# Altium footprint library con-amp.PCBLIB: 295 footprints (part 17 of 19)
Each footprint in its own frame and in the unit in brackets; x right, y up, seen from the top. Pads: shape width x height; smd on the part's side, far side on the other; paste and mask are expansions set on the pad; w line width, h text height; cw(c..) or ccw(c..) is an arc to the next point about the centre after c.
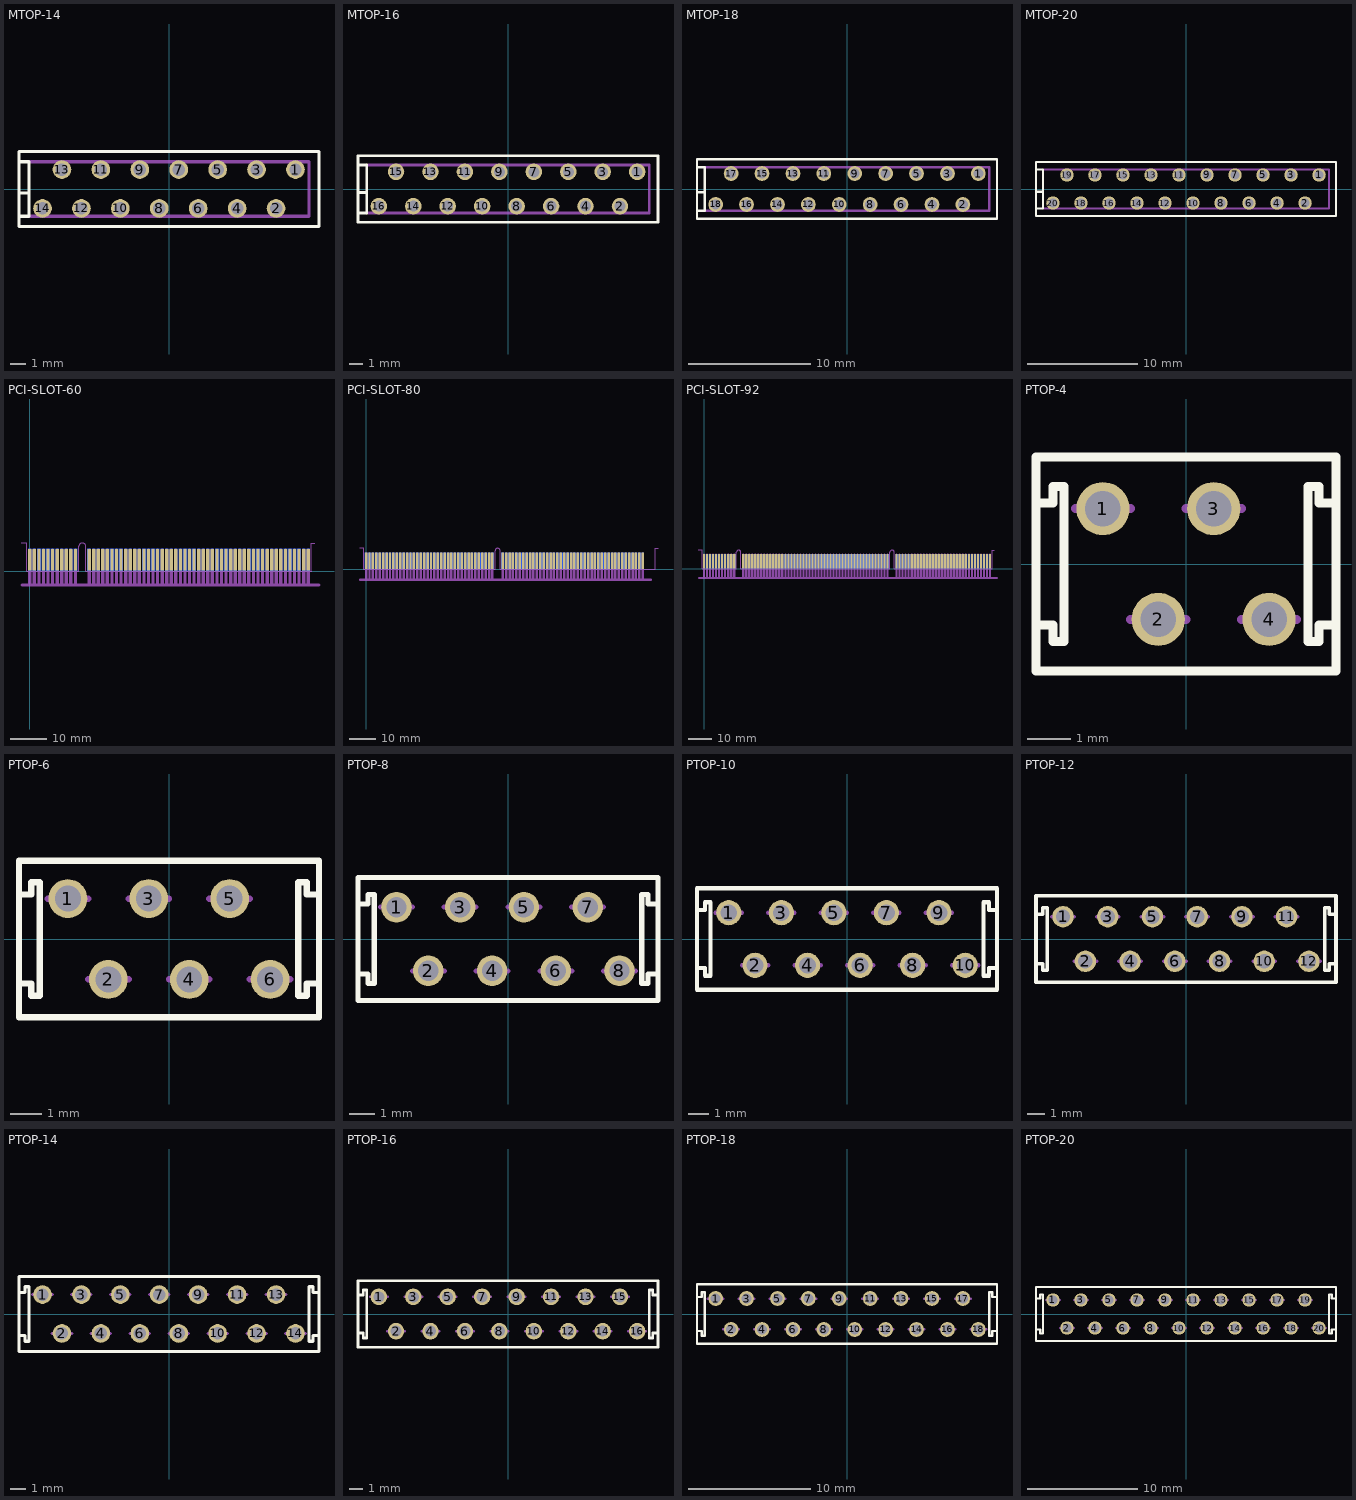
[diagram p16: the footprints below, top view; thin cyan lines are the x and y axes]

## MTOP-14 [mil]
pads (14):
  round 48 hole 32: 1(325,50) 2(275,-50) 3(225,50) 4(175,-50) 5(125,50) 6(75,-50) 7(25,50) 8(-25,-50) 9(-75,50) 10(-125,-50) 11(-175,50) 12(-225,-50) 13(-275,50) 14(-325,-50)
Top Overlay:
  lines w8: -385,-10 -360,-10 ; -385,70 -360,70 -360,-10 ; -385.43,-70 -385.43,96.46 385.43,96.46 385.43,-96.46 -385.43,-96.46 -385.43,-70 ; -385.43,-70 -360,-70 -360,-10
Mechanical 16:
  lines w8: -360,-70 360,-70 360,70 -360,70

## MTOP-16 [mil]
pads (16):
  round 48 hole 32: 1(375,50) 2(325,-50) 3(275,50) 4(225,-50) 5(175,50) 6(125,-50) 7(75,50) 8(25,-50) 9(-25,50) 10(-75,-50) 11(-125,50) 12(-175,-50) 13(-225,50) 14(-275,-50) 15(-325,50) 16(-375,-50)
Top Overlay:
  lines w8: -435,-10 -410,-10 ; -435,70 -410,70 -410,-10 ; -435.43,-70 -435.43,96.46 435.43,96.46 435.43,-96.46 -435.43,-96.46 -435.43,-70 ; -435.43,-70 -410,-70 -410,-10
Mechanical 16:
  lines w8: -410,-70 410,-70 410,70 -410,70

## MTOP-18 [mil]
pads (18):
  round 48 hole 32: 1(425,50) 2(375,-50) 3(325,50) 4(275,-50) 5(225,50) 6(175,-50) 7(125,50) 8(75,-50) 9(25,50) 10(-25,-50) 11(-75,50) 12(-125,-50) 13(-175,50) 14(-225,-50) 15(-275,50) 16(-325,-50) 17(-375,50) 18(-425,-50)
Top Overlay:
  lines w8: -485,-10 -460,-10 ; -485,70 -460,70 -460,-10 ; -485.43,-70 -485.43,96.46 485.43,96.46 485.43,-96.46 -485.43,-96.46 -485.43,-70 ; -485.43,-70 -460,-70 -460,-10
Mechanical 16:
  lines w8: -460,-70 460,-70 460,70 -460,70

## MTOP-20 [mil]
pads (20):
  round 48 hole 32: 1(475,50) 2(425,-50) 3(375,50) 4(325,-50) 5(275,50) 6(225,-50) 7(175,50) 8(125,-50) 9(75,50) 10(25,-50) 11(-25,50) 12(-75,-50) 13(-125,50) 14(-175,-50) 15(-225,50) 16(-275,-50) 17(-325,50) 18(-375,-50) 19(-425,50) 20(-475,-50)
Top Overlay:
  lines w8: -535,-10 -510,-10 ; -535,70 -510,70 -510,-10 ; -535.43,-70 -535.43,96.46 535.43,96.46 535.43,-96.46 -535.43,-96.46 -535.43,-70 ; -535.43,-70 -510,-70 -510,-10
Mechanical 16:
  lines w8: -510,-70 510,-70 510,70 -510,70

## PCI-SLOT-60 [mm]
pads (120):
  rect 0.91x6 smd: 1(0,3.22) 3(1.27,3.22) 5(2.54,3.22) 7(3.81,3.22) 9(5.08,3.22) 11(6.35,3.22) 13(7.62,3.22) 15(8.89,3.22) 17(10.16,3.22) 19(11.43,3.22) 21(12.7,3.22) 23(16.51,3.22) 25(17.78,3.22) 27(19.05,3.22) 29(20.32,3.22) 31(21.59,3.22) 33(22.86,3.22) 35(24.13,3.22) 37(25.4,3.22) 39(26.67,3.22) 41(27.94,3.22) 43(29.21,3.22) 45(30.48,3.22) 47(31.75,3.22) 49(33.02,3.22) 51(34.29,3.22) 53(35.56,3.22) 55(36.83,3.22) 57(38.1,3.22) 59(39.37,3.22) 61(40.64,3.22) 63(41.91,3.22) 65(43.18,3.22) 67(44.45,3.22) 69(45.72,3.22) 71(46.99,3.22) 73(48.26,3.22) 75(49.53,3.22) 77(50.8,3.22) 79(52.07,3.22) 81(53.34,3.22) 83(54.61,3.22) 85(55.88,3.22) 87(57.15,3.22) 89(58.42,3.22) 91(59.69,3.22) 93(60.96,3.22) 95(62.23,3.22) 97(63.5,3.22) 99(64.77,3.22) 101(66.04,3.22) 103(67.31,3.22) 105(68.58,3.22) 107(69.85,3.22) 109(71.12,3.22) 111(72.39,3.22) 113(73.66,3.22) 115(74.93,3.22) 117(76.2,3.22) 119(77.47,3.22)
  rect 0.91x6 smd far side: 2(0,3.22) 4(1.27,3.22) 6(2.54,3.22) 8(3.81,3.22) 10(5.08,3.22) 12(6.35,3.22) 14(7.62,3.22) 16(8.89,3.22) 18(10.16,3.22) 20(11.43,3.22) 22(12.7,3.22) 24(16.51,3.22) 26(17.78,3.22) 28(19.05,3.22) 30(20.32,3.22) 32(21.59,3.22) 34(22.86,3.22) 36(24.13,3.22) 38(25.4,3.22) 40(26.67,3.22) 42(27.94,3.22) 44(29.21,3.22) 46(30.48,3.22) 48(31.75,3.22) 50(33.02,3.22) 52(34.29,3.22) 54(35.56,3.22) 56(36.83,3.22) 58(38.1,3.22) 60(39.37,3.22) 62(40.64,3.22) 64(41.91,3.22) 66(43.18,3.22) 68(44.45,3.22) 70(45.72,3.22) 72(46.99,3.22) 74(48.26,3.22) 76(49.53,3.22) 78(50.8,3.22) 80(52.07,3.22) 82(53.34,3.22) 84(54.61,3.22) 86(55.88,3.22) 88(57.15,3.22) 90(58.42,3.22) 92(59.69,3.22) 94(60.96,3.22) 96(62.23,3.22) 98(63.5,3.22) 100(64.77,3.22) 102(66.04,3.22) 104(67.31,3.22) 106(68.58,3.22) 108(69.85,3.22) 110(71.12,3.22) 112(72.39,3.22) 114(73.66,3.22) 116(74.93,3.22) 118(76.2,3.22) 120(77.47,3.22)
Mechanical 1:
  lines w0: -2.4,7.87 -0.88,7.87 -0.88,0 13.655,0 13.655,6.915 cw(c14.61,6.915) 15.565,6.915 15.565,0 78.36,0 ; 78.425,0 78.36,0 ; 79.32,7.87 78.36,7.87 78.36,0
Mechanical 23:
  lines w0.9: -2.15,-3.81 80.4,-3.81
  lines w0.91: 0,-3.52 0,5.915 ; 1.27,-3.52 1.27,5.915 ; 2.54,-3.52 2.54,5.915 ; 3.81,-3.52 3.81,5.915 ; 5.08,-3.52 5.08,5.915 ; 6.35,-3.52 6.35,5.915 ; 7.62,-3.52 7.62,5.915 ; 8.89,-3.52 8.89,5.915 ; 10.16,-3.52 10.16,5.915 ; 11.43,-3.52 11.43,5.915 ; 12.7,-3.52 12.7,5.915 ; 16.51,-3.52 16.51,5.915 ; 17.78,-3.52 17.78,5.915 ; 19.05,-3.52 19.05,5.915 ; 20.32,-3.52 20.32,5.915 ; 21.59,-3.52 21.59,5.915 ; 22.86,-3.52 22.86,5.915 ; 24.13,-3.52 24.13,5.915 ; 25.4,-3.52 25.4,5.915 ; 26.67,-3.52 26.67,5.915 ; 27.94,-3.52 27.94,5.915 ; 29.21,-3.52 29.21,5.915 ; 30.48,-3.52 30.48,5.915 ; 31.75,-3.52 31.75,5.915 ; 33.02,-3.52 33.02,5.915 ; 34.29,-3.52 34.29,5.915 ; 35.56,-3.52 35.56,5.915 ; 36.83,-3.52 36.83,5.915 ; 38.1,-3.52 38.1,5.915 ; 39.37,-3.52 39.37,5.915 ; 40.64,-3.52 40.64,5.915 ; 41.91,-3.52 41.91,5.915 ; 43.18,-3.52 43.18,5.915 ; 44.45,-3.52 44.45,5.915 ; 45.72,-3.52 45.72,5.915 ; 46.99,-3.52 46.99,5.915 ; 48.26,-3.52 48.26,5.915 ; 49.53,-3.52 49.53,5.915 ; 50.8,-3.52 50.8,5.915 ; 52.07,-3.52 52.07,5.915 ; 53.34,-3.52 53.34,5.915 ; 54.61,-3.52 54.61,5.915 ; 55.88,-3.52 55.88,5.915 ; 57.15,-3.52 57.15,5.915 ; 58.42,-3.52 58.42,5.915 ; 59.69,-3.52 59.69,5.915 ; 60.96,-3.52 60.96,5.915 ; 62.23,-3.52 62.23,5.915 ; 63.5,-3.52 63.5,5.915 ; 64.77,-3.52 64.77,5.915 ; 66.04,-3.52 66.04,5.915 ; 67.31,-3.52 67.31,5.915 ; 68.58,-3.52 68.58,5.915 ; 69.85,-3.52 69.85,5.915 ; 71.12,-3.52 71.12,5.915 ; 72.39,-3.52 72.39,5.915 ; 73.66,-3.52 73.66,5.915 ; 74.93,-3.52 74.93,5.915 ; 76.2,-3.52 76.2,5.915 ; 77.47,-3.52 77.47,5.915
Mechanical 24:
  lines w0.9: -2.15,-3.81 80.4,-3.81
  lines w0.91: 0,-3.52 0,5.915 ; 1.27,-3.52 1.27,5.915 ; 2.54,-3.52 2.54,5.915 ; 3.81,-3.52 3.81,5.915 ; 5.08,-3.52 5.08,5.915 ; 6.35,-3.52 6.35,5.915 ; 7.62,-3.52 7.62,5.915 ; 8.89,-3.52 8.89,5.915 ; 10.16,-3.52 10.16,5.915 ; 11.43,-3.52 11.43,5.915 ; 12.7,-3.52 12.7,5.915 ; 16.51,-3.52 16.51,5.915 ; 17.78,-3.52 17.78,5.915 ; 19.05,-3.52 19.05,5.915 ; 20.32,-3.52 20.32,5.915 ; 21.59,-3.52 21.59,5.915 ; 22.86,-3.52 22.86,5.915 ; 24.13,-3.52 24.13,5.915 ; 25.4,-3.52 25.4,5.915 ; 26.67,-3.52 26.67,5.915 ; 27.94,-3.52 27.94,5.915 ; 29.21,-3.52 29.21,5.915 ; 30.48,-3.52 30.48,5.915 ; 31.75,-3.52 31.75,5.915 ; 33.02,-3.52 33.02,5.915 ; 34.29,-3.52 34.29,5.915 ; 35.56,-3.52 35.56,5.915 ; 36.83,-3.52 36.83,5.915 ; 38.1,-3.52 38.1,5.915 ; 39.37,-3.52 39.37,5.915 ; 40.64,-3.52 40.64,5.915 ; 41.91,-3.52 41.91,5.915 ; 43.18,-3.52 43.18,5.915 ; 44.45,-3.52 44.45,5.915 ; 45.72,-3.52 45.72,5.915 ; 46.99,-3.52 46.99,5.915 ; 48.26,-3.52 48.26,5.915 ; 49.53,-3.52 49.53,5.915 ; 50.8,-3.52 50.8,5.915 ; 52.07,-3.52 52.07,5.915 ; 53.34,-3.52 53.34,5.915 ; 54.61,-3.52 54.61,5.915 ; 55.88,-3.52 55.88,5.915 ; 57.15,-3.52 57.15,5.915 ; 58.42,-3.52 58.42,5.915 ; 59.69,-3.52 59.69,5.915 ; 60.96,-3.52 60.96,5.915 ; 62.23,-3.52 62.23,5.915 ; 63.5,-3.52 63.5,5.915 ; 64.77,-3.52 64.77,5.915 ; 66.04,-3.52 66.04,5.915 ; 67.31,-3.52 67.31,5.915 ; 68.58,-3.52 68.58,5.915 ; 69.85,-3.52 69.85,5.915 ; 71.12,-3.52 71.12,5.915 ; 72.39,-3.52 72.39,5.915 ; 73.66,-3.52 73.66,5.915 ; 74.93,-3.52 74.93,5.915 ; 76.2,-3.52 76.2,5.915 ; 77.47,-3.52 77.47,5.915

## PCI-SLOT-80 [mm]
pads (160):
  rect 0.91x6 smd: 1(0,3.22) 3(1.27,3.22) 5(2.54,3.22) 7(3.81,3.22) 9(5.08,3.22) 11(6.35,3.22) 13(7.62,3.22) 15(8.89,3.22) 17(10.16,3.22) 19(11.43,3.22) 21(12.7,3.22) 23(13.97,3.22) 25(15.24,3.22) 27(16.51,3.22) 29(17.78,3.22) 31(19.05,3.22) 33(20.32,3.22) 35(21.59,3.22) 37(22.86,3.22) 39(24.13,3.22) 41(25.4,3.22) 43(26.67,3.22) 45(27.94,3.22) 47(29.21,3.22) 49(30.48,3.22) 51(31.75,3.22) 53(33.02,3.22) 55(34.29,3.22) 57(35.56,3.22) 59(36.83,3.22) 61(38.1,3.22) 63(39.37,3.22) 65(40.64,3.22) 67(41.91,3.22) 69(43.18,3.22) 71(44.45,3.22) 73(45.72,3.22) 75(46.99,3.22) 77(50.8,3.22) 79(52.07,3.22) 81(53.34,3.22) 83(54.61,3.22) 85(55.88,3.22) 87(57.15,3.22) 89(58.42,3.22) 91(59.69,3.22) 93(60.96,3.22) 95(62.23,3.22) 97(63.5,3.22) 99(64.77,3.22) 101(66.04,3.22) 103(67.31,3.22) 105(68.58,3.22) 107(69.85,3.22) 109(71.12,3.22) 111(72.39,3.22) 113(73.66,3.22) 115(74.93,3.22) 117(76.2,3.22) 119(77.47,3.22) 121(78.74,3.22) 123(80.01,3.22) 125(81.28,3.22) 127(82.55,3.22) 129(83.82,3.22) 131(85.09,3.22) 133(86.36,3.22) 135(87.63,3.22) 137(88.9,3.22) 139(90.17,3.22) 141(91.44,3.22) 143(92.71,3.22) 145(93.98,3.22) 147(95.25,3.22) 149(96.52,3.22) 151(97.79,3.22) 153(99.06,3.22) 155(100.33,3.22) 157(101.6,3.22) 159(102.87,3.22)
  rect 0.91x6 smd far side: 2(0,3.22) 4(1.27,3.22) 6(2.54,3.22) 8(3.81,3.22) 10(5.08,3.22) 12(6.35,3.22) 14(7.62,3.22) 16(8.89,3.22) 18(10.16,3.22) 20(11.43,3.22) 22(12.7,3.22) 24(13.97,3.22) 26(15.24,3.22) 28(16.51,3.22) 30(17.78,3.22) 32(19.05,3.22) 34(20.32,3.22) 36(21.59,3.22) 38(22.86,3.22) 40(24.13,3.22) 42(25.4,3.22) 44(26.67,3.22) 46(27.94,3.22) 48(29.21,3.22) 50(30.48,3.22) 52(31.75,3.22) 54(33.02,3.22) 56(34.29,3.22) 58(35.56,3.22) 60(36.83,3.22) 62(38.1,3.22) 64(39.37,3.22) 66(40.64,3.22) 68(41.91,3.22) 70(43.18,3.22) 72(44.45,3.22) 74(45.72,3.22) 76(46.99,3.22) 78(50.8,3.22) 80(52.07,3.22) 82(53.34,3.22) 84(54.61,3.22) 86(55.88,3.22) 88(57.15,3.22) 90(58.42,3.22) 92(59.69,3.22) 94(60.96,3.22) 96(62.23,3.22) 98(63.5,3.22) 100(64.77,3.22) 102(66.04,3.22) 104(67.31,3.22) 106(68.58,3.22) 108(69.85,3.22) 110(71.12,3.22) 112(72.39,3.22) 114(73.66,3.22) 116(74.93,3.22) 118(76.2,3.22) 120(77.47,3.22) 122(78.74,3.22) 124(80.01,3.22) 126(81.28,3.22) 128(82.55,3.22) 130(83.82,3.22) 132(85.09,3.22) 134(86.36,3.22) 136(87.63,3.22) 138(88.9,3.22) 140(90.17,3.22) 142(91.44,3.22) 144(92.71,3.22) 146(93.98,3.22) 148(95.25,3.22) 150(96.52,3.22) 152(97.79,3.22) 154(99.06,3.22) 156(100.33,3.22) 158(101.6,3.22) 160(102.87,3.22)
Mechanical 1:
  lines w0: -2.4,7.87 -0.88,7.87 -0.88,0 47.945,0 47.945,6.915 cw(c48.9,6.915) 49.855,6.915 49.855,0 107.57,0 107.57,7.87 108.53,7.87
Mechanical 23:
  lines w0.9: -2.15,-3.81 105.8,-3.81
  lines w0.91: 0,-3.52 0,5.915 ; 1.27,-3.52 1.27,5.915 ; 2.54,-3.52 2.54,5.915 ; 3.81,-3.52 3.81,5.915 ; 5.08,-3.52 5.08,5.915 ; 6.35,-3.52 6.35,5.915 ; 7.62,-3.52 7.62,5.915 ; 8.89,-3.52 8.89,5.915 ; 10.16,-3.52 10.16,5.915 ; 11.43,-3.52 11.43,5.915 ; 12.7,-3.52 12.7,5.915 ; 13.97,-3.52 13.97,5.915 ; 15.24,-3.52 15.24,5.915 ; 16.51,-3.52 16.51,5.915 ; 17.78,-3.52 17.78,5.915 ; 19.05,-3.52 19.05,5.915 ; 20.32,-3.52 20.32,5.915 ; 21.59,-3.52 21.59,5.915 ; 22.86,-3.52 22.86,5.915 ; 24.13,-3.52 24.13,5.915 ; 25.4,-3.52 25.4,5.915 ; 26.67,-3.52 26.67,5.915 ; 27.94,-3.52 27.94,5.915 ; 29.21,-3.52 29.21,5.915 ; 30.48,-3.52 30.48,5.915 ; 31.75,-3.52 31.75,5.915 ; 33.02,-3.52 33.02,5.915 ; 34.29,-3.52 34.29,5.915 ; 35.56,-3.52 35.56,5.915 ; 36.83,-3.52 36.83,5.915 ; 38.1,-3.52 38.1,5.915 ; 39.37,-3.52 39.37,5.915 ; 40.64,-3.52 40.64,5.915 ; 41.91,-3.52 41.91,5.915 ; 43.18,-3.52 43.18,5.915 ; 44.45,-3.52 44.45,5.915 ; 45.72,-3.52 45.72,5.915 ; 46.99,-3.52 46.99,5.915 ; 50.8,-3.52 50.8,5.915 ; 52.07,-3.52 52.07,5.915 ; 53.34,-3.52 53.34,5.915 ; 54.61,-3.52 54.61,5.915 ; 55.88,-3.52 55.88,5.915 ; 57.15,-3.52 57.15,5.915 ; 58.42,-3.52 58.42,5.915 ; 59.69,-3.52 59.69,5.915 ; 60.96,-3.52 60.96,5.915 ; 62.23,-3.52 62.23,5.915 ; 63.5,-3.52 63.5,5.915 ; 64.77,-3.52 64.77,5.915 ; 66.04,-3.52 66.04,5.915 ; 67.31,-3.52 67.31,5.915 ; 68.58,-3.52 68.58,5.915 ; 69.85,-3.52 69.85,5.915 ; 71.12,-3.52 71.12,5.915 ; 72.39,-3.52 72.39,5.915 ; 73.66,-3.52 73.66,5.915 ; 74.93,-3.52 74.93,5.915 ; 76.2,-3.52 76.2,5.915 ; 77.47,-3.52 77.47,5.915 ; 78.74,-3.52 78.74,5.915 ; 80.01,-3.52 80.01,5.915 ; 81.28,-3.52 81.28,5.915 ; 82.55,-3.52 82.55,5.915 ; 83.82,-3.52 83.82,5.915 ; 85.09,-3.52 85.09,5.915 ; 86.36,-3.52 86.36,5.915 ; 87.63,-3.52 87.63,5.915 ; 88.9,-3.52 88.9,5.915 ; 90.17,-3.52 90.17,5.915 ; 91.44,-3.52 91.44,5.915 ; 92.71,-3.52 92.71,5.915 ; 93.98,-3.52 93.98,5.915 ; 95.25,-3.52 95.25,5.915 ; 96.52,-3.52 96.52,5.915 ; 97.79,-3.52 97.79,5.915 ; 99.06,-3.52 99.06,5.915 ; 100.33,-3.52 100.33,5.915 ; 101.6,-3.52 101.6,5.915 ; 102.87,-3.52 102.87,5.915
Mechanical 24:
  lines w0.9: -2.15,-3.81 105.8,-3.81
  lines w0.91: 0,-3.52 0,5.915 ; 1.27,-3.52 1.27,5.915 ; 2.54,-3.52 2.54,5.915 ; 3.81,-3.52 3.81,5.915 ; 5.08,-3.52 5.08,5.915 ; 6.35,-3.52 6.35,5.915 ; 7.62,-3.52 7.62,5.915 ; 8.89,-3.52 8.89,5.915 ; 10.16,-3.52 10.16,5.915 ; 11.43,-3.52 11.43,5.915 ; 12.7,-3.52 12.7,5.915 ; 13.97,-3.52 13.97,5.915 ; 15.24,-3.52 15.24,5.915 ; 16.51,-3.52 16.51,5.915 ; 17.78,-3.52 17.78,5.915 ; 19.05,-3.52 19.05,5.915 ; 20.32,-3.52 20.32,5.915 ; 21.59,-3.52 21.59,5.915 ; 22.86,-3.52 22.86,5.915 ; 24.13,-3.52 24.13,5.915 ; 25.4,-3.52 25.4,5.915 ; 26.67,-3.52 26.67,5.915 ; 27.94,-3.52 27.94,5.915 ; 29.21,-3.52 29.21,5.915 ; 30.48,-3.52 30.48,5.915 ; 31.75,-3.52 31.75,5.915 ; 33.02,-3.52 33.02,5.915 ; 34.29,-3.52 34.29,5.915 ; 35.56,-3.52 35.56,5.915 ; 36.83,-3.52 36.83,5.915 ; 38.1,-3.52 38.1,5.915 ; 39.37,-3.52 39.37,5.915 ; 40.64,-3.52 40.64,5.915 ; 41.91,-3.52 41.91,5.915 ; 43.18,-3.52 43.18,5.915 ; 44.45,-3.52 44.45,5.915 ; 45.72,-3.52 45.72,5.915 ; 46.99,-3.52 46.99,5.915 ; 50.8,-3.52 50.8,5.915 ; 52.07,-3.52 52.07,5.915 ; 53.34,-3.52 53.34,5.915 ; 54.61,-3.52 54.61,5.915 ; 55.88,-3.52 55.88,5.915 ; 57.15,-3.52 57.15,5.915 ; 58.42,-3.52 58.42,5.915 ; 59.69,-3.52 59.69,5.915 ; 60.96,-3.52 60.96,5.915 ; 62.23,-3.52 62.23,5.915 ; 63.5,-3.52 63.5,5.915 ; 64.77,-3.52 64.77,5.915 ; 66.04,-3.52 66.04,5.915 ; 67.31,-3.52 67.31,5.915 ; 68.58,-3.52 68.58,5.915 ; 69.85,-3.52 69.85,5.915 ; 71.12,-3.52 71.12,5.915 ; 72.39,-3.52 72.39,5.915 ; 73.66,-3.52 73.66,5.915 ; 74.93,-3.52 74.93,5.915 ; 76.2,-3.52 76.2,5.915 ; 77.47,-3.52 77.47,5.915 ; 78.74,-3.52 78.74,5.915 ; 80.01,-3.52 80.01,5.915 ; 81.28,-3.52 81.28,5.915 ; 82.55,-3.52 82.55,5.915 ; 83.82,-3.52 83.82,5.915 ; 85.09,-3.52 85.09,5.915 ; 86.36,-3.52 86.36,5.915 ; 87.63,-3.52 87.63,5.915 ; 88.9,-3.52 88.9,5.915 ; 90.17,-3.52 90.17,5.915 ; 91.44,-3.52 91.44,5.915 ; 92.71,-3.52 92.71,5.915 ; 93.98,-3.52 93.98,5.915 ; 95.25,-3.52 95.25,5.915 ; 96.52,-3.52 96.52,5.915 ; 97.79,-3.52 97.79,5.915 ; 99.06,-3.52 99.06,5.915 ; 100.33,-3.52 100.33,5.915 ; 101.6,-3.52 101.6,5.915 ; 102.87,-3.52 102.87,5.915

## PCI-SLOT-92 [mm]
pads (184):
  rect 0.91x6 smd: 1(0,3.22) 3(1.27,3.22) 5(2.54,3.22) 7(3.81,3.22) 9(5.08,3.22) 11(6.35,3.22) 13(7.62,3.22) 15(8.89,3.22) 17(10.16,3.22) 19(11.43,3.22) 21(12.7,3.22) 23(16.51,3.22) 25(17.78,3.22) 27(19.05,3.22) 29(20.32,3.22) 31(21.59,3.22) 33(22.86,3.22) 35(24.13,3.22) 37(25.4,3.22) 39(26.67,3.22) 41(27.94,3.22) 43(29.21,3.22) 45(30.48,3.22) 47(31.75,3.22) 49(33.02,3.22) 51(34.29,3.22) 53(35.56,3.22) 55(36.83,3.22) 57(38.1,3.22) 59(39.37,3.22) 61(40.64,3.22) 63(41.91,3.22) 65(43.18,3.22) 67(44.45,3.22) 69(45.72,3.22) 71(46.99,3.22) 73(48.26,3.22) 75(49.53,3.22) 77(50.8,3.22) 79(52.07,3.22) 81(53.34,3.22) 83(54.61,3.22) 85(55.88,3.22) 87(57.15,3.22) 89(58.42,3.22) 91(59.69,3.22) 93(60.96,3.22) 95(62.23,3.22) 97(63.5,3.22) 99(64.77,3.22) 101(66.04,3.22) 103(67.31,3.22) 105(68.58,3.22) 107(69.85,3.22) 109(71.12,3.22) 111(72.39,3.22) 113(73.66,3.22) 115(74.93,3.22) 117(76.2,3.22) 119(77.47,3.22) 121(81.28,3.22) 123(82.55,3.22) 125(83.82,3.22) 127(85.09,3.22) 129(86.36,3.22) 131(87.63,3.22) 133(88.9,3.22) 135(90.17,3.22) 137(91.44,3.22) 139(92.71,3.22) 141(93.98,3.22) 143(95.25,3.22) 145(96.52,3.22) 147(97.79,3.22) 149(99.06,3.22) 151(100.33,3.22) 153(101.6,3.22) 155(102.87,3.22) 157(104.14,3.22) 159(105.41,3.22) 161(106.68,3.22) 163(107.95,3.22) 165(109.22,3.22) 167(110.49,3.22) 169(111.76,3.22) 171(113.03,3.22) 173(114.3,3.22) 175(115.57,3.22) 177(116.84,3.22) 179(118.11,3.22) 181(119.38,3.22) 183(120.65,3.22)
  rect 0.91x6 smd far side: 2(0,3.22) 4(1.27,3.22) 6(2.54,3.22) 8(3.81,3.22) 10(5.08,3.22) 12(6.35,3.22) 14(7.62,3.22) 16(8.89,3.22) 18(10.16,3.22) 20(11.43,3.22) 22(12.7,3.22) 24(16.51,3.22) 26(17.78,3.22) 28(19.05,3.22) 30(20.32,3.22) 32(21.59,3.22) 34(22.86,3.22) 36(24.13,3.22) 38(25.4,3.22) 40(26.67,3.22) 42(27.94,3.22) 44(29.21,3.22) 46(30.48,3.22) 48(31.75,3.22) 50(33.02,3.22) 52(34.29,3.22) 54(35.56,3.22) 56(36.83,3.22) 58(38.1,3.22) 60(39.37,3.22) 62(40.64,3.22) 64(41.91,3.22) 66(43.18,3.22) 68(44.45,3.22) 70(45.72,3.22) 72(46.99,3.22) 74(48.26,3.22) 76(49.53,3.22) 78(50.8,3.22) 80(52.07,3.22) 82(53.34,3.22) 84(54.61,3.22) 86(55.88,3.22) 88(57.15,3.22) 90(58.42,3.22) 92(59.69,3.22) 94(60.96,3.22) 96(62.23,3.22) 98(63.5,3.22) 100(64.77,3.22) 102(66.04,3.22) 104(67.31,3.22) 106(68.58,3.22) 108(69.85,3.22) 110(71.12,3.22) 112(72.39,3.22) 114(73.66,3.22) 116(74.93,3.22) 118(76.2,3.22) 120(77.47,3.22) 122(81.28,3.22) 124(82.55,3.22) 126(83.82,3.22) 128(85.09,3.22) 130(86.36,3.22) 132(87.63,3.22) 134(88.9,3.22) 136(90.17,3.22) 138(91.44,3.22) 140(92.71,3.22) 142(93.98,3.22) 144(95.25,3.22) 146(96.52,3.22) 148(97.79,3.22) 150(99.06,3.22) 152(100.33,3.22) 154(101.6,3.22) 156(102.87,3.22) 158(104.14,3.22) 160(105.41,3.22) 162(106.68,3.22) 164(107.95,3.22) 166(109.22,3.22) 168(110.49,3.22) 170(111.76,3.22) 172(113.03,3.22) 174(114.3,3.22) 176(115.57,3.22) 178(116.84,3.22) 180(118.11,3.22) 182(119.38,3.22) 184(120.65,3.22)
Mechanical 1:
  lines w0: -2.4,7.87 -0.88,7.87 -0.88,0 13.655,0 13.655,6.915 cw(c14.61,6.915) 15.565,6.915 15.565,0 78.425,0 78.425,6.915 cw(c79.38,6.915) 80.335,6.915 80.335,0 121.54,0 121.54,7.87 122.5,7.87
Mechanical 23:
  lines w0.9: -2.15,-3.81 123.58,-3.81
  lines w0.91: 0,-3.52 0,5.915 ; 1.27,-3.52 1.27,5.915 ; 2.54,-3.52 2.54,5.915 ; 3.81,-3.52 3.81,5.915 ; 5.08,-3.52 5.08,5.915 ; 6.35,-3.52 6.35,5.915 ; 7.62,-3.52 7.62,5.915 ; 8.89,-3.52 8.89,5.915 ; 10.16,-3.52 10.16,5.915 ; 11.43,-3.52 11.43,5.915 ; 12.7,-3.52 12.7,5.915 ; 16.51,-3.52 16.51,5.915 ; 17.78,-3.52 17.78,5.915 ; 19.05,-3.52 19.05,5.915 ; 20.32,-3.52 20.32,5.915 ; 21.59,-3.52 21.59,5.915 ; 22.86,-3.52 22.86,5.915 ; 24.13,-3.52 24.13,5.915 ; 25.4,-3.52 25.4,5.915 ; 26.67,-3.52 26.67,5.915 ; 27.94,-3.52 27.94,5.915 ; 29.21,-3.52 29.21,5.915 ; 30.48,-3.52 30.48,5.915 ; 31.75,-3.52 31.75,5.915 ; 33.02,-3.52 33.02,5.915 ; 34.29,-3.52 34.29,5.915 ; 35.56,-3.52 35.56,5.915 ; 36.83,-3.52 36.83,5.915 ; 38.1,-3.52 38.1,5.915 ; 39.37,-3.52 39.37,5.915 ; 40.64,-3.52 40.64,5.915 ; 41.91,-3.52 41.91,5.915 ; 43.18,-3.52 43.18,5.915 ; 44.45,-3.52 44.45,5.915 ; 45.72,-3.52 45.72,5.915 ; 46.99,-3.52 46.99,5.915 ; 48.26,-3.52 48.26,5.915 ; 49.53,-3.52 49.53,5.915 ; 50.8,-3.52 50.8,5.915 ; 52.07,-3.52 52.07,5.915 ; 53.34,-3.52 53.34,5.915 ; 54.61,-3.52 54.61,5.915 ; 55.88,-3.52 55.88,5.915 ; 57.15,-3.52 57.15,5.915 ; 58.42,-3.52 58.42,5.915 ; 59.69,-3.52 59.69,5.915 ; 60.96,-3.52 60.96,5.915 ; 62.23,-3.52 62.23,5.915 ; 63.5,-3.52 63.5,5.915 ; 64.77,-3.52 64.77,5.915 ; 66.04,-3.52 66.04,5.915 ; 67.31,-3.52 67.31,5.915 ; 68.58,-3.52 68.58,5.915 ; 69.85,-3.52 69.85,5.915 ; 71.12,-3.52 71.12,5.915 ; 72.39,-3.52 72.39,5.915 ; 73.66,-3.52 73.66,5.915 ; 74.93,-3.52 74.93,5.915 ; 76.2,-3.52 76.2,5.915 ; 77.47,-3.52 77.47,5.915 ; 81.28,-3.52 81.28,5.915 ; 82.55,-3.52 82.55,5.915 ; 83.82,-3.52 83.82,5.915 ; 85.09,-3.52 85.09,5.915 ; 86.36,-3.52 86.36,5.915 ; 87.63,-3.52 87.63,5.915 ; 88.9,-3.52 88.9,5.915 ; 90.17,-3.52 90.17,5.915 ; 91.44,-3.52 91.44,5.915 ; 92.71,-3.52 92.71,5.915 ; 93.98,-3.52 93.98,5.915 ; 95.25,-3.52 95.25,5.915 ; 96.52,-3.52 96.52,5.915 ; 97.79,-3.52 97.79,5.915 ; 99.06,-3.52 99.06,5.915 ; 100.33,-3.52 100.33,5.915 ; 101.6,-3.52 101.6,5.915 ; 102.87,-3.52 102.87,5.915 ; 104.14,-3.52 104.14,5.915 ; 105.41,-3.52 105.41,5.915 ; 106.68,-3.52 106.68,5.915 ; 107.95,-3.52 107.95,5.915 ; 109.22,-3.52 109.22,5.915 ; 110.49,-3.52 110.49,5.915 ; 111.76,-3.52 111.76,5.915 ; 113.03,-3.52 113.03,5.915 ; 114.3,-3.52 114.3,5.915 ; 115.57,-3.52 115.57,5.915 ; 116.84,-3.52 116.84,5.915 ; 118.11,-3.52 118.11,5.915 ; 119.38,-3.52 119.38,5.915 ; 120.65,-3.52 120.65,5.915
Mechanical 24:
  lines w0.9: -2.15,-3.81 123.58,-3.81
  lines w0.91: 0,-3.52 0,5.915 ; 1.27,-3.52 1.27,5.915 ; 2.54,-3.52 2.54,5.915 ; 3.81,-3.52 3.81,5.915 ; 5.08,-3.52 5.08,5.915 ; 6.35,-3.52 6.35,5.915 ; 7.62,-3.52 7.62,5.915 ; 8.89,-3.52 8.89,5.915 ; 10.16,-3.52 10.16,5.915 ; 11.43,-3.52 11.43,5.915 ; 12.7,-3.52 12.7,5.915 ; 16.51,-3.52 16.51,5.915 ; 17.78,-3.52 17.78,5.915 ; 19.05,-3.52 19.05,5.915 ; 20.32,-3.52 20.32,5.915 ; 21.59,-3.52 21.59,5.915 ; 22.86,-3.52 22.86,5.915 ; 24.13,-3.52 24.13,5.915 ; 25.4,-3.52 25.4,5.915 ; 26.67,-3.52 26.67,5.915 ; 27.94,-3.52 27.94,5.915 ; 29.21,-3.52 29.21,5.915 ; 30.48,-3.52 30.48,5.915 ; 31.75,-3.52 31.75,5.915 ; 33.02,-3.52 33.02,5.915 ; 34.29,-3.52 34.29,5.915 ; 35.56,-3.52 35.56,5.915 ; 36.83,-3.52 36.83,5.915 ; 38.1,-3.52 38.1,5.915 ; 39.37,-3.52 39.37,5.915 ; 40.64,-3.52 40.64,5.915 ; 41.91,-3.52 41.91,5.915 ; 43.18,-3.52 43.18,5.915 ; 44.45,-3.52 44.45,5.915 ; 45.72,-3.52 45.72,5.915 ; 46.99,-3.52 46.99,5.915 ; 48.26,-3.52 48.26,5.915 ; 49.53,-3.52 49.53,5.915 ; 50.8,-3.52 50.8,5.915 ; 52.07,-3.52 52.07,5.915 ; 53.34,-3.52 53.34,5.915 ; 54.61,-3.52 54.61,5.915 ; 55.88,-3.52 55.88,5.915 ; 57.15,-3.52 57.15,5.915 ; 58.42,-3.52 58.42,5.915 ; 59.69,-3.52 59.69,5.915 ; 60.96,-3.52 60.96,5.915 ; 62.23,-3.52 62.23,5.915 ; 63.5,-3.52 63.5,5.915 ; 64.77,-3.52 64.77,5.915 ; 66.04,-3.52 66.04,5.915 ; 67.31,-3.52 67.31,5.915 ; 68.58,-3.52 68.58,5.915 ; 69.85,-3.52 69.85,5.915 ; 71.12,-3.52 71.12,5.915 ; 72.39,-3.52 72.39,5.915 ; 73.66,-3.52 73.66,5.915 ; 74.93,-3.52 74.93,5.915 ; 76.2,-3.52 76.2,5.915 ; 77.47,-3.52 77.47,5.915 ; 81.28,-3.52 81.28,5.915 ; 82.55,-3.52 82.55,5.915 ; 83.82,-3.52 83.82,5.915 ; 85.09,-3.52 85.09,5.915 ; 86.36,-3.52 86.36,5.915 ; 87.63,-3.52 87.63,5.915 ; 88.9,-3.52 88.9,5.915 ; 90.17,-3.52 90.17,5.915 ; 91.44,-3.52 91.44,5.915 ; 92.71,-3.52 92.71,5.915 ; 93.98,-3.52 93.98,5.915 ; 95.25,-3.52 95.25,5.915 ; 96.52,-3.52 96.52,5.915 ; 97.79,-3.52 97.79,5.915 ; 99.06,-3.52 99.06,5.915 ; 100.33,-3.52 100.33,5.915 ; 101.6,-3.52 101.6,5.915 ; 102.87,-3.52 102.87,5.915 ; 104.14,-3.52 104.14,5.915 ; 105.41,-3.52 105.41,5.915 ; 106.68,-3.52 106.68,5.915 ; 107.95,-3.52 107.95,5.915 ; 109.22,-3.52 109.22,5.915 ; 110.49,-3.52 110.49,5.915 ; 111.76,-3.52 111.76,5.915 ; 113.03,-3.52 113.03,5.915 ; 114.3,-3.52 114.3,5.915 ; 115.57,-3.52 115.57,5.915 ; 116.84,-3.52 116.84,5.915 ; 118.11,-3.52 118.11,5.915 ; 119.38,-3.52 119.38,5.915 ; 120.65,-3.52 120.65,5.915

## PTOP-4 [mil]
pads (4):
  round 48 hole 32: 1(-75,50) 2(-25,-50) 3(25,50) 4(75,-50)
Top Overlay:
  lines w8: -135,-55 -120,-55 -120,-70 -110,-70 -110,70 -120,70 -120,55 -135,55 ; 135,-55 120,-55 120,-70 110,-70 110,70 120,70 120,55 135,55 ; -135.43,-96.46 135.43,-96.46 135.43,96.46 -135.43,96.46 -135.43,-96.46
Mechanical 16:
  lines w8: -100,50 -50,50 ; -50,-50 0,-50 ; 0,50 50,50 ; 50,-50 100,-50

## PTOP-6 [mil]
pads (6):
  round 48 hole 32: 1(-125,50) 2(-75,-50) 3(-25,50) 4(25,-50) 5(75,50) 6(125,-50)
Top Overlay:
  lines w8: -185,-55 -170,-55 -170,-70 -160,-70 -160,70 -170,70 -170,55 -185,55 ; 185,-55 170,-55 170,-70 160,-70 160,70 170,70 170,55 185,55 ; -185.43,-96.46 185.43,-96.46 185.43,96.46 -185.43,96.46 -185.43,-96.46
Mechanical 16:
  lines w8: -150,50 -100,50 ; -100,-50 -50,-50 ; -50,50 0,50 ; 0,-50 50,-50 ; 50,50 100,50 ; 100,-50 150,-50

## PTOP-8 [mil]
pads (8):
  round 48 hole 32: 1(-175,50) 2(-125,-50) 3(-75,50) 4(-25,-50) 5(25,50) 6(75,-50) 7(125,50) 8(175,-50)
Top Overlay:
  lines w8: -235,-55 -220,-55 -220,-70 -210,-70 -210,70 -220,70 -220,55 -235,55 ; 235,-55 220,-55 220,-70 210,-70 210,70 220,70 220,55 235,55 ; -235.43,-96.46 235.43,-96.46 235.43,96.46 -235.43,96.46 -235.43,-96.46
Mechanical 16:
  lines w8: -200,50 -150,50 ; -150,-50 -100,-50 ; -100,50 -50,50 ; -50,-50 0,-50 ; 0,50 50,50 ; 50,-50 100,-50 ; 100,50 150,50 ; 150,-50 200,-50

## PTOP-10 [mil]
pads (10):
  round 48 hole 32: 1(-225,50) 2(-175,-50) 3(-125,50) 4(-75,-50) 5(-25,50) 6(25,-50) 7(75,50) 8(125,-50) 9(175,50) 10(225,-50)
Top Overlay:
  lines w8: -285,-55 -270,-55 -270,-70 -260,-70 -260,70 -270,70 -270,55 -285,55 ; 285,-55 270,-55 270,-70 260,-70 260,70 270,70 270,55 285,55 ; -285.43,-96.46 285.43,-96.46 285.43,96.46 -285.43,96.46 -285.43,-96.46
Mechanical 16:
  lines w8: -250,50 -200,50 ; -200,-50 -150,-50 ; -150,50 -100,50 ; -100,-50 -50,-50 ; -50,50 0,50 ; 0,-50 50,-50 ; 50,50 100,50 ; 100,-50 150,-50 ; 150,50 200,50 ; 200,-50 250,-50

## PTOP-12 [mil]
pads (12):
  round 48 hole 32: 1(-275,50) 2(-225,-50) 3(-175,50) 4(-125,-50) 5(-75,50) 6(-25,-50) 7(25,50) 8(75,-50) 9(125,50) 10(175,-50) 11(225,50) 12(275,-50)
Top Overlay:
  lines w8: -335,-55 -320,-55 -320,-70 -310,-70 -310,70 -320,70 -320,55 -335,55 ; 335,-55 320,-55 320,-70 310,-70 310,70 320,70 320,55 335,55 ; -335.43,-96.46 335.43,-96.46 335.43,96.46 -335.43,96.46 -335.43,-96.46
Mechanical 16:
  lines w8: -300,50 -250,50 ; -250,-50 -200,-50 ; -200,50 -150,50 ; -150,-50 -100,-50 ; -100,50 -50,50 ; -50,-50 0,-50 ; 0,50 50,50 ; 50,-50 100,-50 ; 100,50 150,50 ; 150,-50 200,-50 ; 200,50 250,50 ; 250,-50 300,-50

## PTOP-14 [mil]
pads (14):
  round 48 hole 32: 1(-325,50) 2(-275,-50) 3(-225,50) 4(-175,-50) 5(-125,50) 6(-75,-50) 7(-25,50) 8(25,-50) 9(75,50) 10(125,-50) 11(175,50) 12(225,-50) 13(275,50) 14(325,-50)
Top Overlay:
  lines w8: -385,-55 -370,-55 -370,-70 -360,-70 -360,70 -370,70 -370,55 -385,55 ; 385,-55 370,-55 370,-70 360,-70 360,70 370,70 370,55 385,55 ; -385.43,-96.46 385.43,-96.46 385.43,96.46 -385.43,96.46 -385.43,-96.46
Mechanical 16:
  lines w8: -350,50 -300,50 ; -300,-50 -250,-50 ; -250,50 -200,50 ; -200,-50 -150,-50 ; -150,50 -100,50 ; -100,-50 -50,-50 ; -50,50 0,50 ; 0,-50 50,-50 ; 50,50 100,50 ; 100,-50 150,-50 ; 150,50 200,50 ; 200,-50 250,-50 ; 250,50 300,50 ; 300,-50 350,-50

## PTOP-16 [mil]
pads (16):
  round 48 hole 32: 1(-375,50) 2(-325,-50) 3(-275,50) 4(-225,-50) 5(-175,50) 6(-125,-50) 7(-75,50) 8(-25,-50) 9(25,50) 10(75,-50) 11(125,50) 12(175,-50) 13(225,50) 14(275,-50) 15(325,50) 16(375,-50)
Top Overlay:
  lines w8: -435,-55 -420,-55 -420,-70 -410,-70 -410,70 -420,70 -420,55 -435,55 ; 435,-55 420,-55 420,-70 410,-70 410,70 420,70 420,55 435,55 ; -435.43,-96.46 435.43,-96.46 435.43,96.46 -435.43,96.46 -435.43,-96.46
Mechanical 16:
  lines w8: -400,50 -350,50 ; -350,-50 -300,-50 ; -300,50 -250,50 ; -250,-50 -200,-50 ; -200,50 -150,50 ; -150,-50 -100,-50 ; -100,50 -50,50 ; -50,-50 0,-50 ; 0,50 50,50 ; 50,-50 100,-50 ; 100,50 150,50 ; 150,-50 200,-50 ; 200,50 250,50 ; 250,-50 300,-50 ; 300,50 350,50 ; 350,-50 400,-50

## PTOP-18 [mil]
pads (18):
  round 48 hole 32: 1(-425,50) 2(-375,-50) 3(-325,50) 4(-275,-50) 5(-225,50) 6(-175,-50) 7(-125,50) 8(-75,-50) 9(-25,50) 10(25,-50) 11(75,50) 12(125,-50) 13(175,50) 14(225,-50) 15(275,50) 16(325,-50) 17(375,50) 18(425,-50)
Top Overlay:
  lines w8: -485,-55 -470,-55 -470,-70 -460,-70 -460,70 -470,70 -470,55 -485,55 ; 485,-55 470,-55 470,-70 460,-70 460,70 470,70 470,55 485,55 ; -485.43,-96.46 485.43,-96.46 485.43,96.46 -485.43,96.46 -485.43,-96.46
Mechanical 16:
  lines w8: -450,50 -400,50 ; -400,-50 -350,-50 ; -350,50 -300,50 ; -300,-50 -250,-50 ; -250,50 -200,50 ; -200,-50 -150,-50 ; -150,50 -100,50 ; -100,-50 -50,-50 ; -50,50 0,50 ; 0,-50 50,-50 ; 50,50 100,50 ; 100,-50 150,-50 ; 150,50 200,50 ; 200,-50 250,-50 ; 250,50 300,50 ; 300,-50 350,-50 ; 350,50 400,50 ; 400,-50 450,-50

## PTOP-20 [mil]
pads (20):
  round 48 hole 32: 1(-475,50) 2(-425,-50) 3(-375,50) 4(-325,-50) 5(-275,50) 6(-225,-50) 7(-175,50) 8(-125,-50) 9(-75,50) 10(-25,-50) 11(25,50) 12(75,-50) 13(125,50) 14(175,-50) 15(225,50) 16(275,-50) 17(325,50) 18(375,-50) 19(425,50) 20(475,-50)
Top Overlay:
  lines w8: -535,-55 -520,-55 -520,-70 -510,-70 -510,70 -520,70 -520,55 -535,55 ; 535,-55 520,-55 520,-70 510,-70 510,70 520,70 520,55 535,55 ; -535.43,-96.46 535.43,-96.46 535.43,96.46 -535.43,96.46 -535.43,-96.46
Mechanical 16:
  lines w8: -500,50 -450,50 ; -450,-50 -400,-50 ; -400,50 -350,50 ; -350,-50 -300,-50 ; -300,50 -250,50 ; -250,-50 -200,-50 ; -200,50 -150,50 ; -150,-50 -100,-50 ; -100,50 -50,50 ; -50,-50 0,-50 ; 0,50 50,50 ; 50,-50 100,-50 ; 100,50 150,50 ; 150,-50 200,-50 ; 200,50 250,50 ; 250,-50 300,-50 ; 300,50 350,50 ; 350,-50 400,-50 ; 400,50 450,50 ; 450,-50 500,-50